# Altium footprint library IC.PcbLib: 97 footprints (part 7 of 7)
Each footprint in its own frame and in the unit in brackets; x right, y up, seen from the top. Pads: shape width x height; smd on the part's side, far side on the other; paste and mask are expansions set on the pad; w line width, h text height; cw(c..) or ccw(c..) is an arc to the next point about the centre after c.
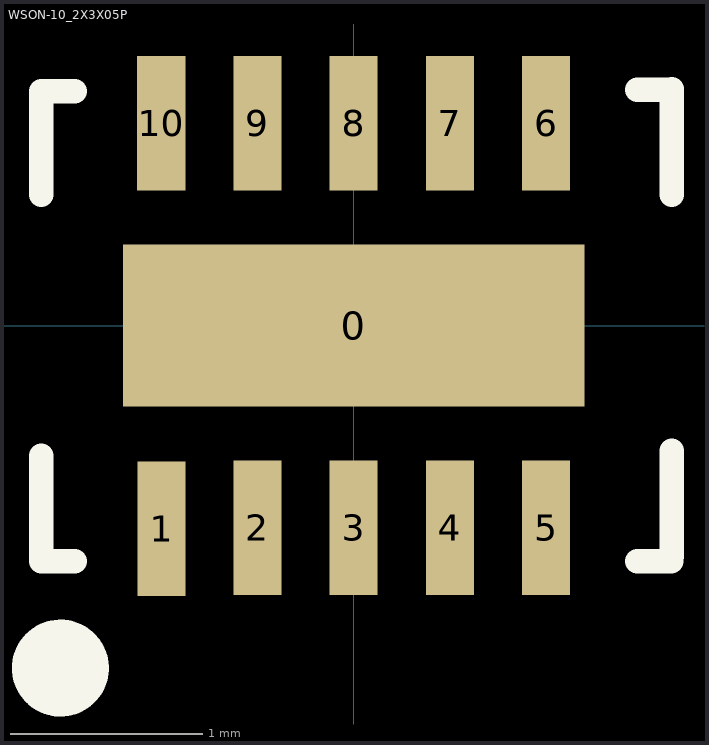
[diagram p6: the footprint, top view; thin cyan lines are the x and y axes]

## WSON-10_2X3X05P [mm]
pads (11):
  rect 2.4x0.84 smd: 0(0,0.003)
  rect 0.25x0.7 smd: 1(-0.999,-1.054) 2(-0.5,-1.049) 3(0,-1.049) 4(0.5,-1.049) 5(1,-1.049) 6(1,1.054) 7(0.5,1.054) 8(0,1.054) 9(-0.5,1.054) 10(-1,1.054)
Top Overlay:
  circle w0.254: c-1.524,-1.778 r0.125
  lines w0.127: -1.624,-0.673 -1.624,-1.223 -1.449,-1.223 ; -1.624,0.682 -1.624,1.219 -1.449,1.219 ; 1.475,-1.223 1.65,-1.223 ; 1.475,1.228 1.65,1.228 ; 1.652,-1.198 1.652,-0.648 ; 1.652,0.682 1.652,1.232
3D body "User Library-TPS62177DQCT.step": height 0.74, standoff -0.01, extent -1.499,-1.011 1.501,0.991